# Altium footprint library smd-ipc.PCBLIB: 363 footprints (part 16 of 27) (continued)
## SQFP-R-14X20-120 [mm] (continued)
  rectangle: -0.4,-8.22 -0.1,-6.95
  rectangle: 0.1,-8.22 0.4,-6.95
  rectangle: 0.6,-8.22 0.9,-6.95
  rectangle: 1.1,-8.22 1.4,-6.95
  rectangle: 1.6,-8.22 1.9,-6.95
  rectangle: 2.1,-8.22 2.4,-6.95
  rectangle: 2.6,-8.22 2.9,-6.95
  rectangle: 3.1,-8.22 3.4,-6.95
  rectangle: 3.6,-8.22 3.9,-6.95
  rectangle: 4.1,-8.22 4.4,-6.95
  rectangle: 4.6,-8.22 4.9,-6.95
  rectangle: 5.1,-8.22 5.4,-6.95
  rectangle: 5.6,-8.22 5.9,-6.95
  rectangle: 6.1,-8.22 6.4,-6.95
  rectangle: 6.6,-8.22 6.9,-6.95
  rectangle: 7.1,-8.22 7.4,-6.95
  rectangle: 7.6,-8.22 7.9,-6.95
  rectangle: 8.1,-8.22 8.4,-6.95
  rectangle: 8.6,-8.22 8.9,-6.95
  rectangle: 9.95,-5.9 11.22,-5.6
  rectangle: 9.95,-5.4 11.22,-5.1
  rectangle: 9.95,-4.9 11.22,-4.6
  rectangle: 9.95,-4.4 11.22,-4.1
  rectangle: 9.95,-3.9 11.22,-3.6
  rectangle: 9.95,-3.4 11.22,-3.1
  rectangle: 9.95,-2.9 11.22,-2.6
  rectangle: 9.95,-2.4 11.22,-2.1
  rectangle: 9.95,-1.9 11.22,-1.6
  rectangle: 9.95,-1.4 11.22,-1.1
  rectangle: 9.95,-0.9 11.22,-0.6
  rectangle: 9.95,-0.4 11.22,-0.1
  rectangle: 9.95,0.1 11.22,0.4
  rectangle: 9.95,0.6 11.22,0.9
  rectangle: 9.95,1.1 11.22,1.4
  rectangle: 9.95,1.6 11.22,1.9
  rectangle: 9.95,2.1 11.22,2.4
  rectangle: 9.95,2.6 11.22,2.9
  rectangle: 9.95,3.1 11.22,3.4
  rectangle: 9.95,3.6 11.22,3.9
  rectangle: 9.95,4.1 11.22,4.4
  rectangle: 9.95,4.6 11.22,4.9
  rectangle: 9.95,5.1 11.22,5.4
  rectangle: 9.95,5.6 11.22,5.9
  rectangle: 8.6,6.95 8.9,8.22
  rectangle: 8.1,6.95 8.4,8.22
  rectangle: 7.6,6.95 7.9,8.22
  rectangle: 7.1,6.95 7.4,8.22
  rectangle: 6.6,6.95 6.9,8.22
  rectangle: 6.1,6.95 6.4,8.22
  rectangle: 5.6,6.95 5.9,8.22
  rectangle: 5.1,6.95 5.4,8.22
  rectangle: 4.6,6.95 4.9,8.22
  rectangle: 4.1,6.95 4.4,8.22
  rectangle: 3.6,6.95 3.9,8.22
  rectangle: 3.1,6.95 3.4,8.22
  rectangle: 2.6,6.95 2.9,8.22
  rectangle: 2.1,6.95 2.4,8.22
  rectangle: 1.6,6.95 1.9,8.22
  rectangle: 1.1,6.95 1.4,8.22
  rectangle: 0.6,6.95 0.9,8.22
  rectangle: 0.1,6.95 0.4,8.22
  rectangle: -0.4,6.95 -0.1,8.22
  rectangle: -0.9,6.95 -0.6,8.22
  rectangle: -1.4,6.95 -1.1,8.22
  rectangle: -1.9,6.95 -1.6,8.22
  rectangle: -2.4,6.95 -2.1,8.22
  rectangle: -2.9,6.95 -2.6,8.22
  rectangle: -3.4,6.95 -3.1,8.22
  rectangle: -3.9,6.95 -3.6,8.22
  rectangle: -4.4,6.95 -4.1,8.22
  rectangle: -4.9,6.95 -4.6,8.22
  rectangle: -5.4,6.95 -5.1,8.22
  rectangle: -5.9,6.95 -5.6,8.22
  rectangle: -6.4,6.95 -6.1,8.22
  rectangle: -6.9,6.95 -6.6,8.22
  rectangle: -7.4,6.95 -7.1,8.22
  rectangle: -7.9,6.95 -7.6,8.22
  rectangle: -8.4,6.95 -8.1,8.22
  rectangle: -8.9,6.95 -8.6,8.22
  rectangle: -11.22,5.6 -9.95,5.9
  rectangle: -11.22,5.1 -9.95,5.4
  rectangle: -11.22,4.6 -9.95,4.9
  rectangle: -11.22,4.1 -9.95,4.4
  rectangle: -11.22,3.6 -9.95,3.9
  rectangle: -11.22,3.1 -9.95,3.4
  rectangle: -11.22,2.6 -9.95,2.9
  rectangle: -11.22,2.1 -9.95,2.4
  rectangle: -11.22,1.6 -9.95,1.9
  rectangle: -11.22,1.1 -9.95,1.4
  rectangle: -11.22,0.6 -9.95,0.9
  rectangle: -11.22,0.1 -9.95,0.4
  rectangle: -11.22,-0.4 -9.95,-0.1
  rectangle: -11.22,-0.9 -9.95,-0.6
  rectangle: -11.22,-1.4 -9.95,-1.1
  rectangle: -11.22,-1.9 -9.95,-1.6
  rectangle: -11.22,-2.4 -9.95,-2.1
  rectangle: -11.22,-2.9 -9.95,-2.6
  rectangle: -11.22,-3.4 -9.95,-3.1
  rectangle: -11.22,-3.9 -9.95,-3.6
  rectangle: -11.22,-4.4 -9.95,-4.1
  rectangle: -11.22,-4.9 -9.95,-4.6
  rectangle: -11.22,-5.4 -9.95,-5.1
  rectangle: -11.22,-5.9 -9.95,-5.6
  lines w0.203: -9.9,-6.9 9.9,-6.9 9.9,6.9 -9.9,6.9 -9.9,-6.9
Mechanical 27:
  lines w0.2: -11.9,-8.9 -11.9,8.9 11.9,8.9 11.9,-8.9 -11.9,-8.9

## SQFP-R-14X20-128 [mm]
pads (128):
  rect 0.3x1.6 smd: 1(-9.25,-7.6) 2(-8.75,-7.6) 3(-8.25,-7.6) 4(-7.75,-7.6) 5(-7.25,-7.6) 6(-6.75,-7.6) 7(-6.25,-7.6) 8(-5.75,-7.6) 9(-5.25,-7.6) 10(-4.75,-7.6) 11(-4.25,-7.6) 12(-3.75,-7.6) 13(-3.25,-7.6) 14(-2.75,-7.6) 15(-2.25,-7.6) 16(-1.75,-7.6) 17(-1.25,-7.6) 18(-0.75,-7.6) 19(-0.25,-7.6) 20(0.25,-7.6) 21(0.75,-7.6) 22(1.25,-7.6) 23(1.75,-7.6) 24(2.25,-7.6) 25(2.75,-7.6) 26(3.25,-7.6) 27(3.75,-7.6) 28(4.25,-7.6) 29(4.75,-7.6) 30(5.25,-7.6) 31(5.75,-7.6) 32(6.25,-7.6) 33(6.75,-7.6) 34(7.25,-7.6) 35(7.75,-7.6) 36(8.25,-7.6) 37(8.75,-7.6) 38(9.25,-7.6) 65(9.25,7.6) 66(8.75,7.6) 67(8.25,7.6) 68(7.75,7.6) 69(7.25,7.6) 70(6.75,7.6) 71(6.25,7.6) 72(5.75,7.6) 73(5.25,7.6) 74(4.75,7.6) 75(4.25,7.6) 76(3.75,7.6) 77(3.25,7.6) 78(2.75,7.6) 79(2.25,7.6) 80(1.75,7.6) 81(1.25,7.6) 82(0.75,7.6) 83(0.25,7.6) 84(-0.25,7.6) 85(-0.75,7.6) 86(-1.25,7.6) 87(-1.75,7.6) 88(-2.25,7.6) 89(-2.75,7.6) 90(-3.25,7.6) 91(-3.75,7.6) 92(-4.25,7.6) 93(-4.75,7.6) 94(-5.25,7.6) 95(-5.75,7.6) 96(-6.25,7.6) 97(-6.75,7.6) 98(-7.25,7.6) 99(-7.75,7.6) 100(-8.25,7.6) 101(-8.75,7.6) 102(-9.25,7.6)
  rect 1.6x0.3 smd: 39(10.6,-6.25) 40(10.6,-5.75) 41(10.6,-5.25) 42(10.6,-4.75) 43(10.6,-4.25) 44(10.6,-3.75) 45(10.6,-3.25) 46(10.6,-2.75) 47(10.6,-2.25) 48(10.6,-1.75) 49(10.6,-1.25) 50(10.6,-0.75) 51(10.6,-0.25) 52(10.6,0.25) 53(10.6,0.75) 54(10.6,1.25) 55(10.6,1.75) 56(10.6,2.25) 57(10.6,2.75) 58(10.6,3.25) 59(10.6,3.75) 60(10.6,4.25) 61(10.6,4.75) 62(10.6,5.25) 63(10.6,5.75) 64(10.6,6.25) 103(-10.6,6.25) 104(-10.6,5.75) 105(-10.6,5.25) 106(-10.6,4.75) 107(-10.6,4.25) 108(-10.6,3.75) 109(-10.6,3.25) 110(-10.6,2.75) 111(-10.6,2.25) 112(-10.6,1.75) 113(-10.6,1.25) 114(-10.6,0.75) 115(-10.6,0.25) 116(-10.6,-0.25) 117(-10.6,-0.75) 118(-10.6,-1.25) 119(-10.6,-1.75) 120(-10.6,-2.25) 121(-10.6,-2.75) 122(-10.6,-3.25) 123(-10.6,-3.75) 124(-10.6,-4.25) 125(-10.6,-4.75) 126(-10.6,-5.25) 127(-10.6,-5.75) 128(-10.6,-6.25)
Top Overlay:
  circle w0.254: c-8.55,-5.4 r0.75
  lines w0.203: -9.57,-6.56 9.56,-6.56 9.56,6.56 -9.57,6.56 -9.57,-6.56
Mechanical 16:
  rectangle: -9.4,-8.22 -9.1,-6.95
  rectangle: -8.9,-8.22 -8.6,-6.95
  rectangle: -8.4,-8.22 -8.1,-6.95
  rectangle: -7.9,-8.22 -7.6,-6.95
  rectangle: -7.4,-8.22 -7.1,-6.95
  rectangle: -6.9,-8.22 -6.6,-6.95
  rectangle: -6.4,-8.22 -6.1,-6.95
  rectangle: -5.9,-8.22 -5.6,-6.95
  rectangle: -5.4,-8.22 -5.1,-6.95
  rectangle: -4.9,-8.22 -4.6,-6.95
  rectangle: -4.4,-8.22 -4.1,-6.95
  rectangle: -3.9,-8.22 -3.6,-6.95
  rectangle: -3.4,-8.22 -3.1,-6.95
  rectangle: -2.9,-8.22 -2.6,-6.95
  rectangle: -2.4,-8.22 -2.1,-6.95
  rectangle: -1.9,-8.22 -1.6,-6.95
  rectangle: -1.4,-8.22 -1.1,-6.95
  rectangle: -0.9,-8.22 -0.6,-6.95
  rectangle: -0.4,-8.22 -0.1,-6.95
  rectangle: 0.1,-8.22 0.4,-6.95
  rectangle: 0.6,-8.22 0.9,-6.95
  rectangle: 1.1,-8.22 1.4,-6.95
  rectangle: 1.6,-8.22 1.9,-6.95
  rectangle: 2.1,-8.22 2.4,-6.95
  rectangle: 2.6,-8.22 2.9,-6.95
  rectangle: 3.1,-8.22 3.4,-6.95
  rectangle: 3.6,-8.22 3.9,-6.95
  rectangle: 4.1,-8.22 4.4,-6.95
  rectangle: 4.6,-8.22 4.9,-6.95
  rectangle: 5.1,-8.22 5.4,-6.95
  rectangle: 5.6,-8.22 5.9,-6.95
  rectangle: 6.1,-8.22 6.4,-6.95
  rectangle: 6.6,-8.22 6.9,-6.95
  rectangle: 7.1,-8.22 7.4,-6.95
  rectangle: 7.6,-8.22 7.9,-6.95
  rectangle: 8.1,-8.22 8.4,-6.95
  rectangle: 9.95,-6.4 11.22,-6.1
  rectangle: 8.6,-8.22 8.9,-6.95
  rectangle: 9.1,-8.22 9.4,-6.95
  rectangle: 9.95,-5.9 11.22,-5.6
  rectangle: 9.95,-5.4 11.22,-5.1
  rectangle: 9.95,-4.9 11.22,-4.6
  rectangle: 9.95,-4.4 11.22,-4.1
  rectangle: 9.95,-3.9 11.22,-3.6
  rectangle: 9.95,-3.4 11.22,-3.1
  rectangle: 9.95,-2.9 11.22,-2.6
  rectangle: 9.95,-2.4 11.22,-2.1
  rectangle: 9.95,-1.9 11.22,-1.6
  rectangle: 9.95,-1.4 11.22,-1.1
  rectangle: 9.95,-0.9 11.22,-0.6
  rectangle: 9.95,-0.4 11.22,-0.1
  rectangle: 9.95,0.1 11.22,0.4
  rectangle: 9.95,0.6 11.22,0.9
  rectangle: 9.95,1.1 11.22,1.4
  rectangle: 9.95,1.6 11.22,1.9
  rectangle: 9.95,2.1 11.22,2.4
  rectangle: 9.95,2.6 11.22,2.9
  rectangle: 9.95,3.1 11.22,3.4
  rectangle: 9.95,3.6 11.22,3.9
  rectangle: 9.95,4.1 11.22,4.4
  rectangle: 9.95,4.6 11.22,4.9
  rectangle: 9.95,5.1 11.22,5.4
  rectangle: 9.95,5.6 11.22,5.9
  rectangle: 9.95,6.1 11.22,6.4
  rectangle: 9.1,6.95 9.4,8.22
  rectangle: 8.6,6.95 8.9,8.22
  rectangle: 8.1,6.95 8.4,8.22
  rectangle: 7.6,6.95 7.9,8.22
  rectangle: 7.1,6.95 7.4,8.22
  rectangle: 6.6,6.95 6.9,8.22
  rectangle: 6.1,6.95 6.4,8.22
  rectangle: 5.6,6.95 5.9,8.22
  rectangle: 5.1,6.95 5.4,8.22
  rectangle: 4.6,6.95 4.9,8.22
  rectangle: 4.1,6.95 4.4,8.22
  rectangle: 3.6,6.95 3.9,8.22
  rectangle: 3.1,6.95 3.4,8.22
  rectangle: 2.6,6.95 2.9,8.22
  rectangle: 2.1,6.95 2.4,8.22
  rectangle: 1.6,6.95 1.9,8.22
  rectangle: 1.1,6.95 1.4,8.22
  rectangle: 0.6,6.95 0.9,8.22
  rectangle: 0.1,6.95 0.4,8.22
  rectangle: -0.4,6.95 -0.1,8.22
  rectangle: -0.9,6.95 -0.6,8.22
  rectangle: -1.4,6.95 -1.1,8.22
  rectangle: -1.9,6.95 -1.6,8.22
  rectangle: -2.4,6.95 -2.1,8.22
  rectangle: -2.9,6.95 -2.6,8.22
  rectangle: -3.4,6.95 -3.1,8.22
  rectangle: -3.9,6.95 -3.6,8.22
  rectangle: -4.4,6.95 -4.1,8.22
  rectangle: -4.9,6.95 -4.6,8.22
  rectangle: -5.4,6.95 -5.1,8.22
  rectangle: -5.9,6.95 -5.6,8.22
  rectangle: -6.4,6.95 -6.1,8.22
  rectangle: -6.9,6.95 -6.6,8.22
  rectangle: -7.4,6.95 -7.1,8.22
  rectangle: -7.9,6.95 -7.6,8.22
  rectangle: -8.4,6.95 -8.1,8.22
  rectangle: -8.9,6.95 -8.6,8.22
  rectangle: -9.4,6.95 -9.1,8.22
  rectangle: -11.22,6.1 -9.95,6.4
  rectangle: -11.22,5.6 -9.95,5.9
  rectangle: -11.22,5.1 -9.95,5.4
  rectangle: -11.22,4.6 -9.95,4.9
  rectangle: -11.22,4.1 -9.95,4.4
  rectangle: -11.22,3.6 -9.95,3.9
  rectangle: -11.22,3.1 -9.95,3.4
  rectangle: -11.22,2.6 -9.95,2.9
  rectangle: -11.22,2.1 -9.95,2.4
  rectangle: -11.22,1.6 -9.95,1.9
  rectangle: -11.22,1.1 -9.95,1.4
  rectangle: -11.22,0.6 -9.95,0.9
  rectangle: -11.22,0.1 -9.95,0.4
  rectangle: -11.22,-0.4 -9.95,-0.1
  rectangle: -11.22,-0.9 -9.95,-0.6
  rectangle: -11.22,-1.4 -9.95,-1.1
  rectangle: -11.22,-1.9 -9.95,-1.6
  rectangle: -11.22,-2.4 -9.95,-2.1
  rectangle: -11.22,-2.9 -9.95,-2.6
  rectangle: -11.22,-3.4 -9.95,-3.1
  rectangle: -11.22,-3.9 -9.95,-3.6
  rectangle: -11.22,-4.4 -9.95,-4.1
  rectangle: -11.22,-4.9 -9.95,-4.6
  rectangle: -11.22,-5.4 -9.95,-5.1
  rectangle: -11.22,-5.9 -9.95,-5.6
  rectangle: -11.22,-6.4 -9.95,-6.1
  lines w0.203: -9.9,-6.9 9.9,-6.9 9.9,6.9 -9.9,6.9 -9.9,-6.9
Mechanical 27:
  lines w0.2: -11.9,-8.9 -11.9,8.9 11.9,8.9 11.9,-8.9 -11.9,-8.9

## SQFP-R-14X20-152 [mm]
pads (152):
  rect 0.25x1.6 smd: 1(-9,-7.6) 2(-8.6,-7.6) 3(-8.2,-7.6) 4(-7.8,-7.6) 5(-7.4,-7.6) 6(-7,-7.6) 7(-6.6,-7.6) 8(-6.2,-7.6) 9(-5.8,-7.6) 10(-5.4,-7.6) 11(-5,-7.6) 12(-4.6,-7.6) 13(-4.2,-7.6) 14(-3.8,-7.6) 15(-3.4,-7.6) 16(-3,-7.6) 17(-2.6,-7.6) 18(-2.2,-7.6) 19(-1.8,-7.6) 20(-1.4,-7.6) 21(-1,-7.6) 22(-0.6,-7.6) 23(-0.2,-7.6) 24(0.2,-7.6) 25(0.6,-7.6) 26(1,-7.6) 27(1.4,-7.6) 28(1.8,-7.6) 29(2.2,-7.6) 30(2.6,-7.6) 31(3,-7.6) 32(3.4,-7.6) 33(3.8,-7.6) 34(4.2,-7.6) 35(4.6,-7.6) 36(5,-7.6) 37(5.4,-7.6) 38(5.8,-7.6) 39(6.2,-7.6) 40(6.6,-7.6) 41(7,-7.6) 42(7.4,-7.6) 43(7.8,-7.6) 44(8.2,-7.6) 45(8.6,-7.6) 46(9,-7.6) 77(9,7.6) 78(8.6,7.6) 79(8.2,7.6) 80(7.8,7.6) 81(7.4,7.6) 82(7,7.6) 83(6.6,7.6) 84(6.2,7.6) 85(5.8,7.6) 86(5.4,7.6) 87(5,7.6) 88(4.6,7.6) 89(4.2,7.6) 90(3.8,7.6) 91(3.4,7.6) 92(3,7.6) 93(2.6,7.6) 94(2.2,7.6) 95(1.8,7.6) 96(1.4,7.6) 97(1,7.6) 98(0.6,7.6) 99(0.2,7.6) 100(-0.2,7.6) 101(-0.6,7.6) 102(-1,7.6) 103(-1.4,7.6) 104(-1.8,7.6) 105(-2.2,7.6) 106(-2.6,7.6) 107(-3,7.6) 108(-3.4,7.6) 109(-3.8,7.6) 110(-4.2,7.6) 111(-4.6,7.6) 112(-5,7.6) 113(-5.4,7.6) 114(-5.8,7.6) 115(-6.2,7.6) 116(-6.6,7.6) 117(-7,7.6) 118(-7.4,7.6) 119(-7.8,7.6) 120(-8.2,7.6) 121(-8.6,7.6) 122(-9,7.6)
  rect 1.6x0.25 smd: 47(10.6,-5.8) 48(10.6,-5.4) 49(10.6,-5) 50(10.6,-4.6) 51(10.6,-4.2) 52(10.6,-3.8) 53(10.6,-3.4) 54(10.6,-3) 55(10.6,-2.6) 56(10.6,-2.2) 57(10.6,-1.8) 58(10.6,-1.4) 59(10.6,-1) 60(10.6,-0.6) 61(10.6,-0.2) 62(10.6,0.2) 63(10.6,0.6) 64(10.6,1) 65(10.6,1.4) 66(10.6,1.8) 67(10.6,2.2) 68(10.6,2.6) 69(10.6,3) 70(10.6,3.4) 71(10.6,3.8) 72(10.6,4.2) 73(10.6,4.6) 74(10.6,5) 75(10.6,5.4) 76(10.6,5.8) 123(-10.6,5.8) 124(-10.6,5.4) 125(-10.6,5) 126(-10.6,4.6) 127(-10.6,4.2) 128(-10.6,3.8) 129(-10.6,3.4) 130(-10.6,3) 131(-10.6,2.6) 132(-10.6,2.2) 133(-10.6,1.8) 134(-10.6,1.4) 135(-10.6,1) 136(-10.6,0.6) 137(-10.6,0.2) 138(-10.6,-0.2) 139(-10.6,-0.6) 140(-10.6,-1) 141(-10.6,-1.4) 142(-10.6,-1.8) 143(-10.6,-2.2) 144(-10.6,-2.6) 145(-10.6,-3) 146(-10.6,-3.4) 147(-10.6,-3.8) 148(-10.6,-4.2) 149(-10.6,-4.6) 150(-10.6,-5) 151(-10.6,-5.4) 152(-10.6,-5.8)
Top Overlay:
  circle w0.254: c-8.55,-5.5 r0.75
  lines w0.203: -9.57,-6.56 9.56,-6.56 9.56,6.56 -9.57,6.56 -9.57,-6.56
Mechanical 16:
  drawing of 156 lines, arcs and shapes, not listed
Mechanical 27:
  lines w0.2: -11.9,-8.9 -11.9,8.9 11.9,8.9 11.9,-8.9 -11.9,-8.9

## SQFP-R-14X20-160 [mm]
pads (160):
  rect 0.25x1.6 smd: 1(-9.4,-7.6) 2(-9,-7.6) 3(-8.6,-7.6) 4(-8.2,-7.6) 5(-7.8,-7.6) 6(-7.4,-7.6) 7(-7,-7.6) 8(-6.6,-7.6) 9(-6.2,-7.6) 10(-5.8,-7.6) 11(-5.4,-7.6) 12(-5,-7.6) 13(-4.6,-7.6) 14(-4.2,-7.6) 15(-3.8,-7.6) 16(-3.4,-7.6) 17(-3,-7.6) 18(-2.6,-7.6) 19(-2.2,-7.6) 20(-1.8,-7.6) 21(-1.4,-7.6) 22(-1,-7.6) 23(-0.6,-7.6) 24(-0.2,-7.6) 25(0.2,-7.6) 26(0.6,-7.6) 27(1,-7.6) 28(1.4,-7.6) 29(1.8,-7.6) 30(2.2,-7.6) 31(2.6,-7.6) 32(3,-7.6) 33(3.4,-7.6) 34(3.8,-7.6) 35(4.2,-7.6) 36(4.6,-7.6) 37(5,-7.6) 38(5.4,-7.6) 39(5.8,-7.6) 40(6.2,-7.6) 41(6.6,-7.6) 42(7,-7.6) 43(7.4,-7.6) 44(7.8,-7.6) 45(8.2,-7.6) 46(8.6,-7.6) 47(9,-7.6) 48(9.4,-7.6) 81(9.4,7.6) 82(9,7.6) 83(8.6,7.6) 84(8.2,7.6) 85(7.8,7.6) 86(7.4,7.6) 87(7,7.6) 88(6.6,7.6) 89(6.2,7.6) 90(5.8,7.6) 91(5.4,7.6) 92(5,7.6) 93(4.6,7.6) 94(4.2,7.6) 95(3.8,7.6) 96(3.4,7.6) 97(3,7.6) 98(2.6,7.6) 99(2.2,7.6) 100(1.8,7.6) 101(1.4,7.6) 102(1,7.6) 103(0.6,7.6) 104(0.2,7.6) 105(-0.2,7.6) 106(-0.6,7.6) 107(-1,7.6) 108(-1.4,7.6) 109(-1.8,7.6) 110(-2.2,7.6) 111(-2.6,7.6) 112(-3,7.6) 113(-3.4,7.6) 114(-3.8,7.6) 115(-4.2,7.6) 116(-4.6,7.6) 117(-5,7.6) 118(-5.4,7.6) 119(-5.8,7.6) 120(-6.2,7.6) 121(-6.6,7.6) 122(-7,7.6) 123(-7.4,7.6) 124(-7.8,7.6) 125(-8.2,7.6) 126(-8.6,7.6) 127(-9,7.6) 128(-9.4,7.6)
  rect 1.6x0.25 smd: 49(10.6,-6.2) 50(10.6,-5.8) 51(10.6,-5.4) 52(10.6,-5) 53(10.6,-4.6) 54(10.6,-4.2) 55(10.6,-3.8) 56(10.6,-3.4) 57(10.6,-3) 58(10.6,-2.6) 59(10.6,-2.2) 60(10.6,-1.8) 61(10.6,-1.4) 62(10.6,-1) 63(10.6,-0.6) 64(10.6,-0.2) 65(10.6,0.2) 66(10.6,0.6) 67(10.6,1) 68(10.6,1.4) 69(10.6,1.8) 70(10.6,2.2) 71(10.6,2.6) 72(10.6,3) 73(10.6,3.4) 74(10.6,3.8) 75(10.6,4.2) 76(10.6,4.6) 77(10.6,5) 78(10.6,5.4) 79(10.6,5.8) 80(10.6,6.2) 129(-10.6,6.2) 130(-10.6,5.8) 131(-10.6,5.4) 132(-10.6,5) 133(-10.6,4.6) 134(-10.6,4.2) 135(-10.6,3.8) 136(-10.6,3.4) 137(-10.6,3) 138(-10.6,2.6) 139(-10.6,2.2) 140(-10.6,1.8) 141(-10.6,1.4) 142(-10.6,1) 143(-10.6,0.6) 144(-10.6,0.2) 145(-10.6,-0.2) 146(-10.6,-0.6) 147(-10.6,-1) 148(-10.6,-1.4) 149(-10.6,-1.8) 150(-10.6,-2.2) 151(-10.6,-2.6) 152(-10.6,-3) 153(-10.6,-3.4) 154(-10.6,-3.8) 155(-10.6,-4.2) 156(-10.6,-4.6) 157(-10.6,-5) 158(-10.6,-5.4) 159(-10.6,-5.8) 160(-10.6,-6.2)
Top Overlay:
  circle w0.254: c-8.55,-5.5 r0.75
  lines w0.203: -9.57,-6.56 9.56,-6.56 9.56,6.56 -9.57,6.56 -9.57,-6.56
Mechanical 16:
  drawing of 164 lines, arcs and shapes, not listed
Mechanical 27:
  lines w0.2: -11.9,-8.9 -11.9,8.9 11.9,8.9 11.9,-8.9 -11.9,-8.9

## SQFP-R-14X20-208 [mm]
pads (208):
  rect 0.17x1.6 smd: 1(-9.15,-7.6) 2(-8.85,-7.6) 3(-8.55,-7.6) 4(-8.25,-7.6) 5(-7.95,-7.6) 6(-7.65,-7.6) 7(-7.35,-7.6) 8(-7.05,-7.6) 9(-6.75,-7.6) 10(-6.45,-7.6) 11(-6.15,-7.6) 12(-5.85,-7.6) 13(-5.55,-7.6) 14(-5.25,-7.6) 15(-4.95,-7.6) 16(-4.65,-7.6) 17(-4.35,-7.6) 18(-4.05,-7.6) 19(-3.75,-7.6) 20(-3.45,-7.6) 21(-3.15,-7.6) 22(-2.85,-7.6) 23(-2.55,-7.6) 24(-2.25,-7.6) 25(-1.95,-7.6) 26(-1.65,-7.6) 27(-1.35,-7.6) 28(-1.05,-7.6) 29(-0.75,-7.6) 30(-0.45,-7.6) 31(-0.15,-7.6) 32(0.15,-7.6) 33(0.45,-7.6) 34(0.75,-7.6) 35(1.05,-7.6) 36(1.35,-7.6) 37(1.65,-7.6) 38(1.95,-7.6) 39(2.25,-7.6) 40(2.55,-7.6) 41(2.85,-7.6) 42(3.15,-7.6) 43(3.45,-7.6) 44(3.75,-7.6) 45(4.05,-7.6) 46(4.35,-7.6) 47(4.65,-7.6) 48(4.95,-7.6) 49(5.25,-7.6) 50(5.55,-7.6) 51(5.85,-7.6) 52(6.15,-7.6) 53(6.45,-7.6) 54(6.75,-7.6) 55(7.05,-7.6) 56(7.35,-7.6) 57(7.65,-7.6) 58(7.95,-7.6) 59(8.25,-7.6) 60(8.55,-7.6) 61(8.85,-7.6) 62(9.15,-7.6) 105(9.15,7.6) 106(8.85,7.6) 107(8.55,7.6) 108(8.25,7.6) 109(7.95,7.6) 110(7.65,7.6) 111(7.35,7.6) 112(7.05,7.6) 113(6.75,7.6) 114(6.45,7.6) 115(6.15,7.6) 116(5.85,7.6) 117(5.55,7.6) 118(5.25,7.6) 119(4.95,7.6) 120(4.65,7.6) 121(4.35,7.6) 122(4.05,7.6) 123(3.75,7.6) 124(3.45,7.6) 125(3.15,7.6) 126(2.85,7.6) 127(2.55,7.6) 128(2.25,7.6) 129(1.95,7.6) 130(1.65,7.6) 131(1.35,7.6) 132(1.05,7.6) 133(0.75,7.6) 134(0.45,7.6) 135(0.15,7.6) 136(-0.15,7.6) 137(-0.45,7.6) 138(-0.75,7.6) 139(-1.05,7.6) 140(-1.35,7.6) 141(-1.65,7.6) 142(-1.95,7.6) 143(-2.25,7.6) 144(-2.55,7.6) 145(-2.85,7.6) 146(-3.15,7.6) 147(-3.45,7.6) 148(-3.75,7.6) 149(-4.05,7.6) 150(-4.35,7.6) 151(-4.65,7.6) 152(-4.95,7.6) 153(-5.25,7.6) 154(-5.55,7.6) 155(-5.85,7.6) 156(-6.15,7.6) 157(-6.45,7.6) 158(-6.75,7.6) 159(-7.05,7.6) 160(-7.35,7.6) 161(-7.65,7.6) 162(-7.95,7.6) 163(-8.25,7.6) 164(-8.55,7.6) 165(-8.85,7.6) 166(-9.15,7.6)
  rect 1.6x0.17 smd: 63(10.6,-6.15) 64(10.6,-5.85) 65(10.6,-5.55) 66(10.6,-5.25) 67(10.6,-4.95) 68(10.6,-4.65) 69(10.6,-4.35) 70(10.6,-4.05) 71(10.6,-3.75) 72(10.6,-3.45) 73(10.6,-3.15) 74(10.6,-2.85) 75(10.6,-2.55) 76(10.6,-2.25) 77(10.6,-1.95) 78(10.6,-1.65) 79(10.6,-1.35) 80(10.6,-1.05) 81(10.6,-0.75) 82(10.6,-0.45) 83(10.6,-0.15) 84(10.6,0.15) 85(10.6,0.45) 86(10.6,0.75) 87(10.6,1.05) 88(10.6,1.35) 89(10.6,1.65) 90(10.6,1.95) 91(10.6,2.25) 92(10.6,2.55) 93(10.6,2.85) 94(10.6,3.15) 95(10.6,3.45) 96(10.6,3.75) 97(10.6,4.05) 98(10.6,4.35) 99(10.6,4.65) 100(10.6,4.95) 101(10.6,5.25) 102(10.6,5.55) 103(10.6,5.85) 104(10.6,6.15) 167(-10.6,6.15) 168(-10.6,5.85) 169(-10.6,5.55) 170(-10.6,5.25) 171(-10.6,4.95) 172(-10.6,4.65) 173(-10.6,4.35) 174(-10.6,4.05) 175(-10.6,3.75) 176(-10.6,3.45) 177(-10.6,3.15) 178(-10.6,2.85) 179(-10.6,2.55) 180(-10.6,2.25) 181(-10.6,1.95) 182(-10.6,1.65) 183(-10.6,1.35) 184(-10.6,1.05) 185(-10.6,0.75) 186(-10.6,0.45) 187(-10.6,0.15) 188(-10.6,-0.15) 189(-10.6,-0.45) 190(-10.6,-0.75) 191(-10.6,-1.05) 192(-10.6,-1.35) 193(-10.6,-1.65) 194(-10.6,-1.95) 195(-10.6,-2.25) 196(-10.6,-2.55) 197(-10.6,-2.85) 198(-10.6,-3.15) 199(-10.6,-3.45) 200(-10.6,-3.75) 201(-10.6,-4.05) 202(-10.6,-4.35) 203(-10.6,-4.65) 204(-10.6,-4.95) 205(-10.6,-5.25) 206(-10.6,-5.55) 207(-10.6,-5.85) 208(-10.6,-6.15)
Top Overlay:
  circle w0.254: c-8.25,-5.5 r0.75
  lines w0.203: -9.57,-6.56 9.56,-6.56 9.56,6.56 -9.57,6.56 -9.57,-6.56
Mechanical 16:
  drawing of 212 lines, arcs and shapes, not listed
Mechanical 27:
  lines w0.2: -11.9,-8.9 -11.9,8.9 11.9,8.9 11.9,-8.9 -11.9,-8.9

## SQFP-R-14X20-216 [mm]
pads (216):
  rect 0.17x1.6 smd: 1(-9.45,-7.6) 2(-9.15,-7.6) 3(-8.85,-7.6) 4(-8.55,-7.6) 5(-8.25,-7.6) 6(-7.95,-7.6) 7(-7.65,-7.6) 8(-7.35,-7.6) 9(-7.05,-7.6) 10(-6.75,-7.6) 11(-6.45,-7.6) 12(-6.15,-7.6) 13(-5.85,-7.6) 14(-5.55,-7.6) 15(-5.25,-7.6) 16(-4.95,-7.6) 17(-4.65,-7.6) 18(-4.35,-7.6) 19(-4.05,-7.6) 20(-3.75,-7.6) 21(-3.45,-7.6) 22(-3.15,-7.6) 23(-2.85,-7.6) 24(-2.55,-7.6) 25(-2.25,-7.6) 26(-1.95,-7.6) 27(-1.65,-7.6) 28(-1.35,-7.6) 29(-1.05,-7.6) 30(-0.75,-7.6) 31(-0.45,-7.6) 32(-0.15,-7.6) 33(0.15,-7.6) 34(0.45,-7.6) 35(0.75,-7.6) 36(1.05,-7.6) 37(1.35,-7.6) 38(1.65,-7.6) 39(1.95,-7.6) 40(2.25,-7.6) 41(2.55,-7.6) 42(2.85,-7.6) 43(3.15,-7.6) 44(3.45,-7.6) 45(3.75,-7.6) 46(4.05,-7.6) 47(4.35,-7.6) 48(4.65,-7.6) 49(4.95,-7.6) 50(5.25,-7.6) 51(5.55,-7.6) 52(5.85,-7.6) 53(6.15,-7.6) 54(6.45,-7.6) 55(6.75,-7.6) 56(7.05,-7.6) 57(7.35,-7.6) 58(7.65,-7.6) 59(7.95,-7.6) 60(8.25,-7.6) 61(8.55,-7.6) 62(8.85,-7.6) 63(9.15,-7.6) 64(9.45,-7.6) 109(9.45,7.6) 110(9.15,7.6) 111(8.85,7.6) 112(8.55,7.6) 113(8.25,7.6) 114(7.95,7.6) 115(7.65,7.6) 116(7.35,7.6) 117(7.05,7.6) 118(6.75,7.6) 119(6.45,7.6) 120(6.15,7.6) 121(5.85,7.6) 122(5.55,7.6) 123(5.25,7.6) 124(4.95,7.6) 125(4.65,7.6) 126(4.35,7.6) 127(4.05,7.6) 128(3.75,7.6) 129(3.45,7.6) 130(3.15,7.6) 131(2.85,7.6) 132(2.55,7.6) 133(2.25,7.6) 134(1.95,7.6) 135(1.65,7.6) 136(1.35,7.6) 137(1.05,7.6) 138(0.75,7.6) 139(0.45,7.6) 140(0.15,7.6) 141(-0.15,7.6) 142(-0.45,7.6) 143(-0.75,7.6) 144(-1.05,7.6) 145(-1.35,7.6) 146(-1.65,7.6) 147(-1.95,7.6) 148(-2.25,7.6) 149(-2.55,7.6) 150(-2.85,7.6) 151(-3.15,7.6) 152(-3.45,7.6) 153(-3.75,7.6) 154(-4.05,7.6) 155(-4.35,7.6) 156(-4.65,7.6) 157(-4.95,7.6) 158(-5.25,7.6) 159(-5.55,7.6) 160(-5.85,7.6) 161(-6.15,7.6) 162(-6.45,7.6) 163(-6.75,7.6) 164(-7.05,7.6) 165(-7.35,7.6) 166(-7.65,7.6) 167(-7.95,7.6) 168(-8.25,7.6) 169(-8.55,7.6) 170(-8.85,7.6) 171(-9.15,7.6) 172(-9.45,7.6)
  rect 1.6x0.17 smd: 65(10.6,-6.45) 66(10.6,-6.15) 67(10.6,-5.85) 68(10.6,-5.55) 69(10.6,-5.25) 70(10.6,-4.95) 71(10.6,-4.65) 72(10.6,-4.35) 73(10.6,-4.05) 74(10.6,-3.75) 75(10.6,-3.45) 76(10.6,-3.15) 77(10.6,-2.85) 78(10.6,-2.55) 79(10.6,-2.25) 80(10.6,-1.95) 81(10.6,-1.65) 82(10.6,-1.35) 83(10.6,-1.05) 84(10.6,-0.75) 85(10.6,-0.45) 86(10.6,-0.15) 87(10.6,0.15) 88(10.6,0.45) 89(10.6,0.75) 90(10.6,1.05) 91(10.6,1.35) 92(10.6,1.65) 93(10.6,1.95) 94(10.6,2.25) 95(10.6,2.55) 96(10.6,2.85) 97(10.6,3.15) 98(10.6,3.45) 99(10.6,3.75) 100(10.6,4.05) 101(10.6,4.35) 102(10.6,4.65) 103(10.6,4.95) 104(10.6,5.25) 105(10.6,5.55) 106(10.6,5.85) 107(10.6,6.15) 108(10.6,6.45) 173(-10.6,6.45) 174(-10.6,6.15) 175(-10.6,5.85) 176(-10.6,5.55) 177(-10.6,5.25) 178(-10.6,4.95) 179(-10.6,4.65) 180(-10.6,4.35) 181(-10.6,4.05) 182(-10.6,3.75) 183(-10.6,3.45) 184(-10.6,3.15) 185(-10.6,2.85) 186(-10.6,2.55) 187(-10.6,2.25) 188(-10.6,1.95) 189(-10.6,1.65) 190(-10.6,1.35) 191(-10.6,1.05) 192(-10.6,0.75) 193(-10.6,0.45) 194(-10.6,0.15) 195(-10.6,-0.15) 196(-10.6,-0.45) 197(-10.6,-0.75) 198(-10.6,-1.05) 199(-10.6,-1.35) 200(-10.6,-1.65) 201(-10.6,-1.95) 202(-10.6,-2.25) 203(-10.6,-2.55) 204(-10.6,-2.85) 205(-10.6,-3.15) 206(-10.6,-3.45) 207(-10.6,-3.75) 208(-10.6,-4.05) 209(-10.6,-4.35) 210(-10.6,-4.65) 211(-10.6,-4.95) 212(-10.6,-5.25) 213(-10.6,-5.55) 214(-10.6,-5.85) 215(-10.6,-6.15) 216(-10.6,-6.45)
Top Overlay:
  circle w0.254: c-8.25,-5.5 r0.75
  lines w0.203: -9.57,-6.56 9.56,-6.56 9.56,6.56 -9.57,6.56 -9.57,-6.56
Mechanical 16:
  drawing of 220 lines, arcs and shapes, not listed
Mechanical 27:
  lines w0.2: -11.9,-8.9 -11.9,8.9 11.9,8.9 11.9,-8.9 -11.9,-8.9

## SQFP-R-20X28-176 [mm]
pads (176):
  rect 0.3x1.6 smd: 1(-12.75,-10.6) 2(-12.25,-10.6) 3(-11.75,-10.6) 4(-11.25,-10.6) 5(-10.75,-10.6) 6(-10.25,-10.6) 7(-9.75,-10.6) 8(-9.25,-10.6) 9(-8.75,-10.6) 10(-8.25,-10.6) 11(-7.75,-10.6) 12(-7.25,-10.6) 13(-6.75,-10.6) 14(-6.25,-10.6) 15(-5.75,-10.6) 16(-5.25,-10.6) 17(-4.75,-10.6) 18(-4.25,-10.6) 19(-3.75,-10.6) 20(-3.25,-10.6) 21(-2.75,-10.6) 22(-2.25,-10.6) 23(-1.75,-10.6) 24(-1.25,-10.6) 25(-0.75,-10.6) 26(-0.25,-10.6) 27(0.25,-10.6) 28(0.75,-10.6) 29(1.25,-10.6) 30(1.75,-10.6) 31(2.25,-10.6) 32(2.75,-10.6) 33(3.25,-10.6) 34(3.75,-10.6) 35(4.25,-10.6) 36(4.75,-10.6) 37(5.25,-10.6) 38(5.75,-10.6) 39(6.25,-10.6) 40(6.75,-10.6) 41(7.25,-10.6) 42(7.75,-10.6) 43(8.25,-10.6) 44(8.75,-10.6) 45(9.25,-10.6) 46(9.75,-10.6) 47(10.25,-10.6) 48(10.75,-10.6) 49(11.25,-10.6) 50(11.75,-10.6) 51(12.25,-10.6) 52(12.75,-10.6) 89(12.75,10.6) 90(12.25,10.6) 91(11.75,10.6) 92(11.25,10.6) 93(10.75,10.6) 94(10.25,10.6) 95(9.75,10.6) 96(9.25,10.6) 97(8.75,10.6) 98(8.25,10.6) 99(7.75,10.6) 100(7.25,10.6) 101(6.75,10.6) 102(6.25,10.6) 103(5.75,10.6) 104(5.25,10.6) 105(4.75,10.6) 106(4.25,10.6) 107(3.75,10.6) 108(3.25,10.6) 109(2.75,10.6) 110(2.25,10.6) 111(1.75,10.6) 112(1.25,10.6) 113(0.75,10.6) 114(0.25,10.6) 115(-0.25,10.6) 116(-0.75,10.6) 117(-1.25,10.6) 118(-1.75,10.6) 119(-2.25,10.6) 120(-2.75,10.6) 121(-3.25,10.6) 122(-3.75,10.6) 123(-4.25,10.6) 124(-4.75,10.6) 125(-5.25,10.6) 126(-5.75,10.6) 127(-6.25,10.6) 128(-6.75,10.6) 129(-7.25,10.6) 130(-7.75,10.6) 131(-8.25,10.6) 132(-8.75,10.6) 133(-9.25,10.6) 134(-9.75,10.6) 135(-10.25,10.6) 136(-10.75,10.6) 137(-11.25,10.6) 138(-11.75,10.6) 139(-12.25,10.6) 140(-12.75,10.6)
  rect 1.6x0.3 smd: 53(14.6,-8.75) 54(14.6,-8.25) 55(14.6,-7.75) 56(14.6,-7.25) 57(14.6,-6.75) 58(14.6,-6.25) 59(14.6,-5.75) 60(14.6,-5.25) 61(14.6,-4.75) 62(14.6,-4.25) 63(14.6,-3.75) 64(14.6,-3.25) 65(14.6,-2.75) 66(14.6,-2.25) 67(14.6,-1.75) 68(14.6,-1.25) 69(14.6,-0.75) 70(14.6,-0.25) 71(14.6,0.25) 72(14.6,0.75) 73(14.6,1.25) 74(14.6,1.75) 75(14.6,2.25) 76(14.6,2.75) 77(14.6,3.25) 78(14.6,3.75) 79(14.6,4.25) 80(14.6,4.75) 81(14.6,5.25) 82(14.6,5.75) 83(14.6,6.25) 84(14.6,6.75) 85(14.6,7.25) 86(14.6,7.75) 87(14.6,8.25) 88(14.6,8.75) 141(-14.6,8.75) 142(-14.6,8.25) 143(-14.6,7.75) 144(-14.6,7.25) 145(-14.6,6.75) 146(-14.6,6.25) 147(-14.6,5.75) 148(-14.6,5.25) 149(-14.6,4.75) 150(-14.6,4.25) 151(-14.6,3.75) 152(-14.6,3.25) 153(-14.6,2.75) 154(-14.6,2.25) 155(-14.6,1.75) 156(-14.6,1.25) 157(-14.6,0.75) 158(-14.6,0.25) 159(-14.6,-0.25) 160(-14.6,-0.75) 161(-14.6,-1.25) 162(-14.6,-1.75) 163(-14.6,-2.25) 164(-14.6,-2.75) 165(-14.6,-3.25) 166(-14.6,-3.75) 167(-14.6,-4.25) 168(-14.6,-4.75) 169(-14.6,-5.25) 170(-14.6,-5.75) 171(-14.6,-6.25) 172(-14.6,-6.75) 173(-14.6,-7.25) 174(-14.6,-7.75) 175(-14.6,-8.25) 176(-14.6,-8.75)
Top Overlay:
  circle w0.254: c-12.25,-8.5 r0.75
  lines w0.203: -13.57,-9.56 13.56,-9.56 13.56,9.56 -13.57,9.56 -13.57,-9.56
Mechanical 16:
  drawing of 180 lines, arcs and shapes, not listed
Mechanical 27:
  lines w0.2: -16.4,-11.9 -16.4,11.9 16.4,11.9 16.4,-11.9 -16.4,-11.9